# Altium integrated library WE_WR-TBL_Spring Clamp System_5.00 mm_rev15b.IntLib: 98 symbols
Pins are listed as number, name and electrical type; pins without a type are passive.

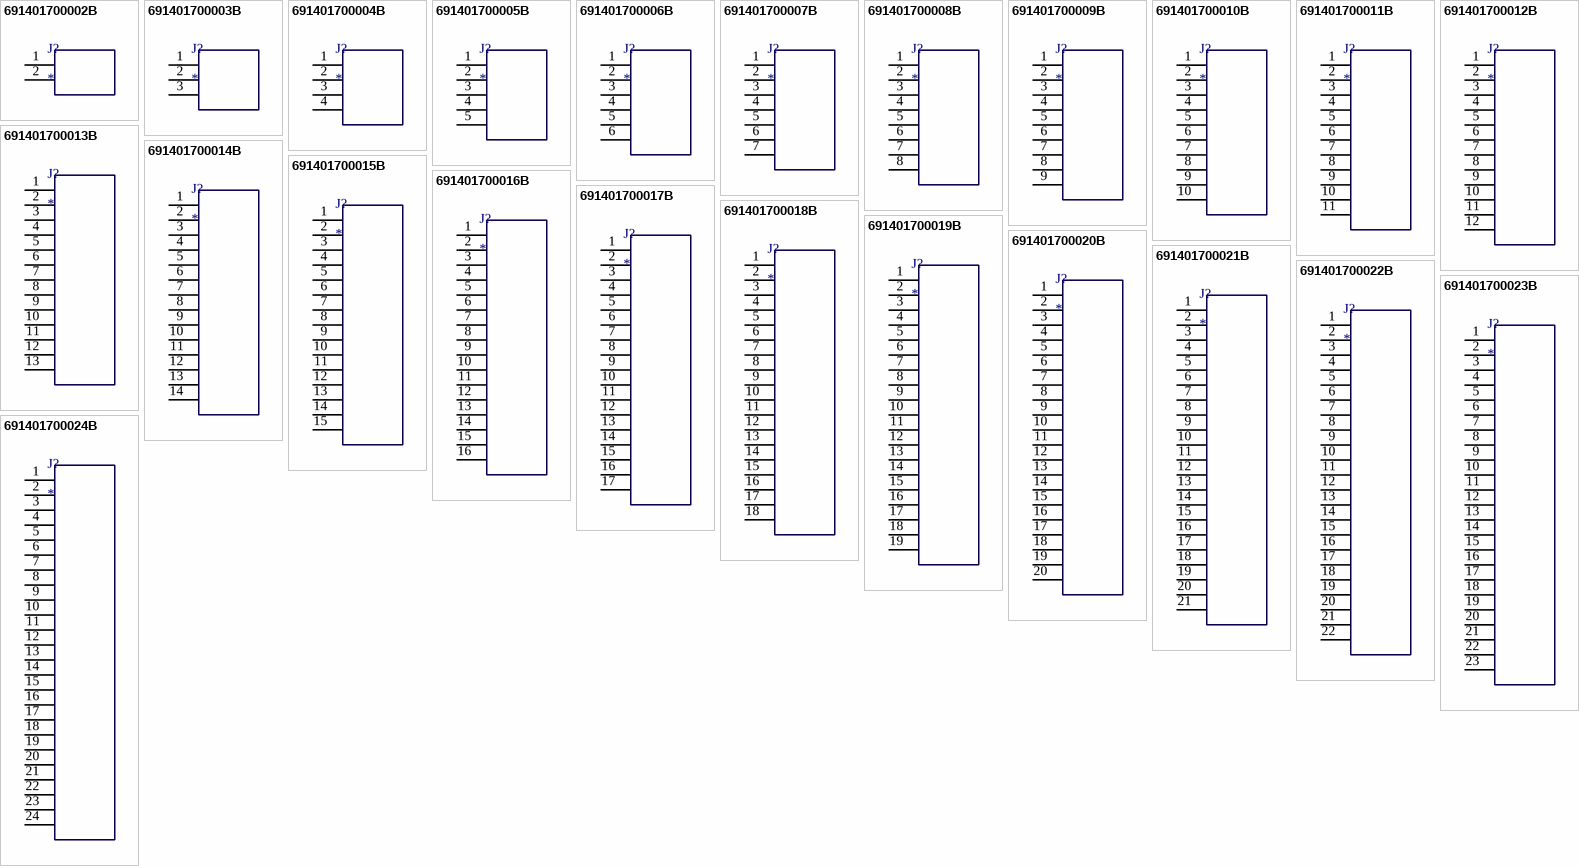
[diagram p0: symbols 691401700002B to 691401700024B]

## 691401700002B
designator J?
WR-TBL Screwless Entry Vertical,Serie 401 B - 5.00 mm; Manufacturer: Würth Elektronik eiSos GmbH; partNo: 691401700002B; ComponentLink1 Description: Manufacturer; ComponentLink2 Description: Datasheet; NoPins: 4; ComponentLink1URL: http://www.we-online.de; ComponentLink2URL: http://katalog.we-online.de/em/datasheet/6914017000xx.pdf; Created by: Karrer Zheng; Created Date: 10/10/2014
footprint 691401700002B
pins: 1  , 2  

## 691401700003B
designator J?
WR-TBL Screwless Entry Vertical,Serie 401 B - 5.00 mm; Manufacturer: Würth Elektronik eiSos GmbH; partNo: 691401700003B; ComponentLink1 Description: Manufacturer; ComponentLink2 Description: Datasheet; NoPins: 6; ComponentLink1URL: http://www.we-online.de; ComponentLink2URL: http://katalog.we-online.de/em/datasheet/6914017000xx.pdf; Created by: Karrer Zheng; Created Date: 10/10/2014
footprint 691401700003B
pins: 1  , 2  , 3  

## 691401700004B
designator J?
WR-TBL Screwless Entry Vertical,Serie 401 B - 5.00 mm; Manufacturer: Würth Elektronik eiSos GmbH; partNo: 691401700004B; ComponentLink1 Description: Manufacturer; ComponentLink2 Description: Datasheet; NoPins: 8; ComponentLink1URL: http://www.we-online.de; ComponentLink2URL: http://katalog.we-online.de/em/datasheet/6914017000xx.pdf; Created by: Karrer Zheng; Created Date: 10/10/2014
footprint 691401700004B
pins: 1  , 2  , 3  , 4  

## 691401700005B
designator J?
WR-TBL Screwless Entry Vertical,Serie 401 B - 5.00 mm; Manufacturer: Würth Elektronik eiSos GmbH; partNo: 691401700005B; ComponentLink1 Description: Manufacturer; ComponentLink2 Description: Datasheet; NoPins: 10; ComponentLink1URL: http://www.we-online.de; ComponentLink2URL: http://katalog.we-online.de/em/datasheet/6914017000xx.pdf; Created by: Karrer Zheng; Created Date: 10/10/2014
footprint 691401700005B
pins: 1  , 2  , 3  , 4  , 5  

## 691401700006B
designator J?
WR-TBL Screwless Entry Vertical,Serie 401 B - 5.00 mm; Manufacturer: Würth Elektronik eiSos GmbH; partNo: 691401700006B; ComponentLink1 Description: Manufacturer; ComponentLink2 Description: Datasheet; NoPins: 12; ComponentLink1URL: http://www.we-online.de; ComponentLink2URL: http://katalog.we-online.de/em/datasheet/6914017000xx.pdf; Created by: Karrer Zheng; Created Date: 10/10/2014
footprint 691401700006B
pins: 1  , 2  , 3  , 4  , 5  , 6  

## 691401700007B
designator J?
WR-TBL Screwless Entry Vertical,Serie 401 B - 5.00 mm; Manufacturer: Würth Elektronik eiSos GmbH; partNo: 691401700007B; ComponentLink1 Description: Manufacturer; ComponentLink2 Description: Datasheet; NoPins: 14; ComponentLink1URL: http://www.we-online.de; ComponentLink2URL: http://katalog.we-online.de/em/datasheet/6914017000xx.pdf; Created by: Karrer Zheng; Created Date: 10/10/2014
footprint 691401700007B
pins: 1  , 2  , 3  , 4  , 5  , 6  , 7  

## 691401700008B
designator J?
WR-TBL Screwless Entry Vertical,Serie 401 B - 5.00 mm; Manufacturer: Würth Elektronik eiSos GmbH; partNo: 691401700008B; ComponentLink1 Description: Manufacturer; ComponentLink2 Description: Datasheet; NoPins: 16; ComponentLink1URL: http://www.we-online.de; ComponentLink2URL: http://katalog.we-online.de/em/datasheet/6914017000xx.pdf; Created by: Karrer Zheng; Created Date: 10/10/2014
footprint 691401700008B
pins: 1  , 2  , 3  , 4  , 5  , 6  , 7  , 8  

## 691401700009B
designator J?
WR-TBL Screwless Entry Vertical,Serie 401 B - 5.00 mm; Manufacturer: Würth Elektronik eiSos GmbH; partNo: 691401700009B; ComponentLink1 Description: Manufacturer; ComponentLink2 Description: Datasheet; NoPins: 18; ComponentLink1URL: http://www.we-online.de; ComponentLink2URL: http://katalog.we-online.de/em/datasheet/6914017000xx.pdf; Created by: Karrer Zheng; Created Date: 10/10/2014
footprint 691401700009B
pins: 1  , 2  , 3  , 4  , 5  , 6  , 7  , 8  , 9  

## 691401700010B
designator J?
WR-TBL Screwless Entry Vertical,Serie 401 B - 5.00 mm; Manufacturer: Würth Elektronik eiSos GmbH; partNo: 691401700010B; ComponentLink1 Description: Manufacturer; ComponentLink2 Description: Datasheet; NoPins: 20; ComponentLink1URL: http://www.we-online.de; ComponentLink2URL: http://katalog.we-online.de/em/datasheet/6914017000xx.pdf; Created by: Karrer Zheng; Created Date: 10/10/2014
footprint 691401700010B
pins: 1  , 2  , 3  , 4  , 5  , 6  , 7  , 8  , 9  , 10  

## 691401700011B
designator J?
WR-TBL Screwless Entry Vertical,Serie 401 B - 5.00 mm; Manufacturer: Würth Elektronik eiSos GmbH; partNo: 691401700011B; ComponentLink1 Description: Manufacturer; ComponentLink2 Description: Datasheet; NoPins: 22; ComponentLink1URL: http://www.we-online.de; ComponentLink2URL: http://katalog.we-online.de/em/datasheet/6914017000xx.pdf; Created by: Karrer Zheng; Created Date: 10/10/2014
footprint 691401700011B
pins: 1  , 2  , 3  , 4  , 5  , 6  , 7  , 8  , 9  , 10  , 11  

## 691401700012B
designator J?
WR-TBL Screwless Entry Vertical,Serie 401 B - 5.00 mm; Manufacturer: Würth Elektronik eiSos GmbH; partNo: 691401700012B; ComponentLink1 Description: Manufacturer; ComponentLink2 Description: Datasheet; NoPins: 24; ComponentLink1URL: http://www.we-online.de; ComponentLink2URL: http://katalog.we-online.de/em/datasheet/6914017000xx.pdf; Created by: Karrer Zheng; Created Date: 10/10/2014
footprint 691401700012B
pins: 1  , 2  , 3  , 4  , 5  , 6  , 7  , 8  , 9  , 10  , 11  , 12  

## 691401700013B
designator J?
WR-TBL Screwless Entry Vertical,Serie 401 B - 5.00 mm; Manufacturer: Würth Elektronik eiSos GmbH; partNo: 691401700013B; ComponentLink1 Description: Manufacturer; ComponentLink2 Description: Datasheet; NoPins: 26; ComponentLink1URL: http://www.we-online.de; ComponentLink2URL: http://katalog.we-online.de/em/datasheet/6914017000xx.pdf; Created by: Karrer Zheng; Created Date: 10/10/2014
footprint 691401700013B
pins: 1  , 2  , 3  , 4  , 5  , 6  , 7  , 8  , 9  , 10  , 11  , 12  , 13  

## 691401700014B
designator J?
WR-TBL Screwless Entry Vertical,Serie 401 B - 5.00 mm; Manufacturer: Würth Elektronik eiSos GmbH; partNo: 691401700014B; ComponentLink1 Description: Manufacturer; ComponentLink2 Description: Datasheet; NoPins: 28; ComponentLink1URL: http://www.we-online.de; ComponentLink2URL: http://katalog.we-online.de/em/datasheet/6914017000xx.pdf; Created by: Karrer Zheng; Created Date: 10/10/2014
footprint 691401700014B
pins: 1  , 2  , 3  , 4  , 5  , 6  , 7  , 8  , 9  , 10  , 11  , 12  , 13  , 14  

## 691401700015B
designator J?
WR-TBL Screwless Entry Vertical,Serie 401 B - 5.00 mm; Manufacturer: Würth Elektronik eiSos GmbH; partNo: 691401700015B; ComponentLink1 Description: Manufacturer; ComponentLink2 Description: Datasheet; NoPins: 30; ComponentLink1URL: http://www.we-online.de; ComponentLink2URL: http://katalog.we-online.de/em/datasheet/6914017000xx.pdf; Created by: Karrer Zheng; Created Date: 10/10/2014
footprint 691401700015B
pins: 1  , 2  , 3  , 4  , 5  , 6  , 7  , 8  , 9  , 10  , 11  , 12  , 13  , 14  , 15  

## 691401700016B
designator J?
WR-TBL Screwless Entry Vertical,Serie 401 B - 5.00 mm; Manufacturer: Würth Elektronik eiSos GmbH; partNo: 691401700016B; ComponentLink1 Description: Manufacturer; ComponentLink2 Description: Datasheet; NoPins: 32; ComponentLink1URL: http://www.we-online.de; ComponentLink2URL: http://katalog.we-online.de/em/datasheet/6914017000xx.pdf; Created by: Karrer Zheng; Created Date: 10/10/2014
footprint 691401700016B
pins: 1  , 2  , 3  , 4  , 5  , 6  , 7  , 8  , 9  , 10  , 11  , 12  , 13  , 14  , 15  , 16  

## 691401700017B
designator J?
WR-TBL Screwless Entry Vertical,Serie 401 B - 5.00 mm; Manufacturer: Würth Elektronik eiSos GmbH; partNo: 691401700017B; ComponentLink1 Description: Manufacturer; ComponentLink2 Description: Datasheet; NoPins: 34; ComponentLink1URL: http://www.we-online.de; ComponentLink2URL: http://katalog.we-online.de/em/datasheet/6914017000xx.pdf; Created by: Karrer Zheng; Created Date: 10/10/2014
footprint 691401700017B
pins: 1  , 2  , 3  , 4  , 5  , 6  , 7  , 8  , 9  , 10  , 11  , 12  , 13  , 14  , 15  , 16  , 17  

## 691401700018B
designator J?
WR-TBL Screwless Entry Vertical,Serie 401 B - 5.00 mm; Manufacturer: Würth Elektronik eiSos GmbH; partNo: 691401700018B; ComponentLink1 Description: Manufacturer; ComponentLink2 Description: Datasheet; NoPins: 36; ComponentLink1URL: http://www.we-online.de; ComponentLink2URL: http://katalog.we-online.de/em/datasheet/6914017000xx.pdf; Created by: Karrer Zheng; Created Date: 10/10/2014
footprint 691401700018B
pins: 1  , 2  , 3  , 4  , 5  , 6  , 7  , 8  , 9  , 10  , 11  , 12  , 13  , 14  , 15  , 16  , 17  , 18  

## 691401700019B
designator J?
WR-TBL Screwless Entry Vertical,Serie 401 B - 5.00 mm; Manufacturer: Würth Elektronik eiSos GmbH; partNo: 691401700019B; ComponentLink1 Description: Manufacturer; ComponentLink2 Description: Datasheet; NoPins: 38; ComponentLink1URL: http://www.we-online.de; ComponentLink2URL: http://katalog.we-online.de/em/datasheet/6914017000xx.pdf; Created by: Karrer Zheng; Created Date: 10/10/2014
footprint 691401700019B
pins: 1  , 2  , 3  , 4  , 5  , 6  , 7  , 8  , 9  , 10  , 11  , 12  , 13  , 14  , 15  , 16  , 17  , 18  , 19  

## 691401700020B
designator J?
WR-TBL Screwless Entry Vertical,Serie 401 B - 5.00 mm; Manufacturer: Würth Elektronik eiSos GmbH; partNo: 691401700020B; ComponentLink1 Description: Manufacturer; ComponentLink2 Description: Datasheet; NoPins: 40; ComponentLink1URL: http://www.we-online.de; ComponentLink2URL: http://katalog.we-online.de/em/datasheet/6914017000xx.pdf; Created by: Karrer Zheng; Created Date: 10/10/2014
footprint 691401700020B
pins: 1  , 2  , 3  , 4  , 5  , 6  , 7  , 8  , 9  , 10  , 11  , 12  , 13  , 14  , 15  , 16  , 17  , 18  , 19  , 20  

## 691401700021B
designator J?
WR-TBL Screwless Entry Vertical,Serie 401 B - 5.00 mm; Manufacturer: Würth Elektronik eiSos GmbH; partNo: 691401700021B; ComponentLink1 Description: Manufacturer; ComponentLink2 Description: Datasheet; NoPins: 42; ComponentLink1URL: http://www.we-online.de; ComponentLink2URL: http://katalog.we-online.de/em/datasheet/6914017000xx.pdf; Created by: Karrer Zheng; Created Date: 10/10/2014
footprint 691401700021B
pins: 1  , 2  , 3  , 4  , 5  , 6  , 7  , 8  , 9  , 10  , 11  , 12  , 13  , 14  , 15  , 16  , 17  , 18  , 19  , 20  , 21  

## 691401700022B
designator J?
WR-TBL Screwless Entry Vertical,Serie 401 B - 5.00 mm; Manufacturer: Würth Elektronik eiSos GmbH; partNo: 691401700022B; ComponentLink1 Description: Manufacturer; ComponentLink2 Description: Datasheet; NoPins: 44; ComponentLink1URL: http://www.we-online.de; ComponentLink2URL: http://katalog.we-online.de/em/datasheet/6914017000xx.pdf; Created by: Karrer Zheng; Created Date: 10/10/2014
footprint 691401700022B
pins: 1  , 2  , 3  , 4  , 5  , 6  , 7  , 8  , 9  , 10  , 11  , 12  , 13  , 14  , 15  , 16  , 17  , 18  , 19  , 20  , 21  , 22  

## 691401700023B
designator J?
WR-TBL Screwless Entry Vertical,Serie 401 B - 5.00 mm; Manufacturer: Würth Elektronik eiSos GmbH; partNo: 691401700023B; ComponentLink1 Description: Manufacturer; ComponentLink2 Description: Datasheet; NoPins: 46; ComponentLink1URL: http://www.we-online.de; ComponentLink2URL: http://katalog.we-online.de/em/datasheet/6914017000xx.pdf; Created by: Karrer Zheng; Created Date: 10/10/2014
footprint 691401700023B
pins: 1  , 2  , 3  , 4  , 5  , 6  , 7  , 8  , 9  , 10  , 11  , 12  , 13  , 14  , 15  , 16  , 17  , 18  , 19  , 20  , 21  , 22  , 23  

## 691401700024B
designator J?
WR-TBL Screwless Entry Vertical,Serie 401 B - 5.00 mm; Manufacturer: Würth Elektronik eiSos GmbH; partNo: 691401700024B; ComponentLink1 Description: Manufacturer; ComponentLink2 Description: Datasheet; NoPins: 48; ComponentLink1URL: http://www.we-online.de; ComponentLink2URL: http://katalog.we-online.de/em/datasheet/6914017000xx.pdf; Created by: Karrer Zheng; Created Date: 10/10/2014
footprint 691401700024B
pins: 1  , 2  , 3  , 4  , 5  , 6  , 7  , 8  , 9  , 10  , 11  , 12  , 13  , 14  , 15  , 16  , 17  , 18  , 19  , 20  , 21  , 22  , 23  , 24  


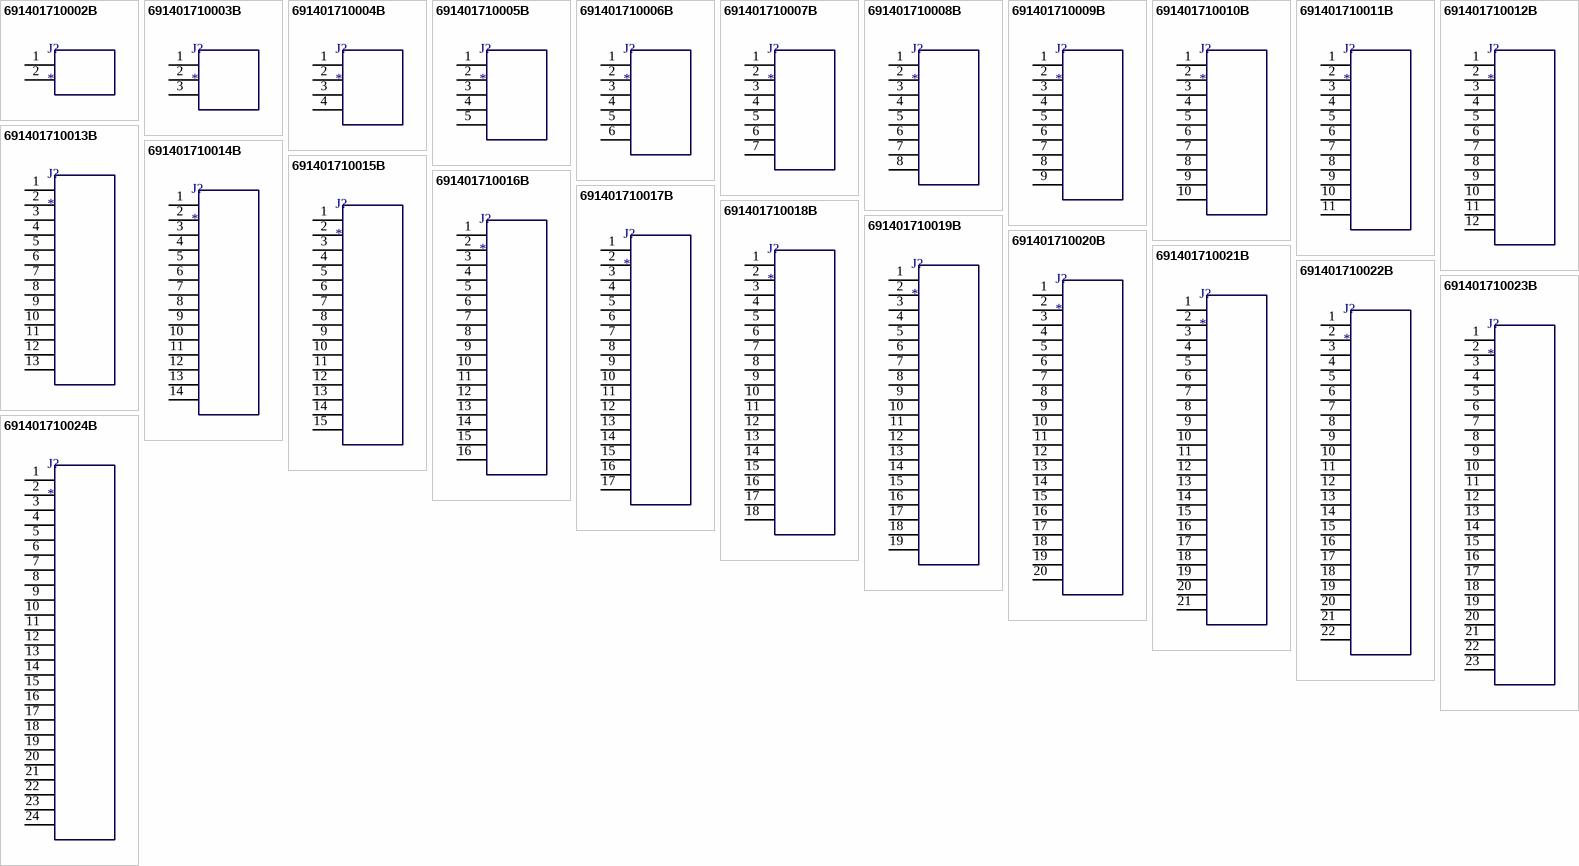
[diagram p1: symbols 691401710002B to 691401710024B]

## 691401710002B
designator J?
WR-TBL Screwless Entry Horizontal,Serie 401 B - 5.00 mm; Manufacturer: Würth Elektronik eiSos GmbH; partNo: 691401710002B; ComponentLink1 Description: Manufacturer; ComponentLink2 Description: Datasheet; NoPins: 4; ComponentLink1URL: http://www.we-online.de; ComponentLink2URL: http://katalog.we-online.de/em/datasheet/6914017100xx.pdf; Created by: Karrer Zheng; Created Date: 10/10/2014
footprint 691401710002B
pins: 1  , 2  

## 691401710003B
designator J?
WR-TBL Screwless Entry Horizontal,Serie 401 B - 5.00 mm; Manufacturer: Würth Elektronik eiSos GmbH; partNo: 691401710003B; ComponentLink1 Description: Manufacturer; ComponentLink2 Description: Datasheet; NoPins: 6; ComponentLink1URL: http://www.we-online.de; ComponentLink2URL: http://katalog.we-online.de/em/datasheet/6914017100xx.pdf; Created by: Karrer Zheng; Created Date: 10/10/2014
footprint 691401710003B
pins: 1  , 2  , 3  

## 691401710004B
designator J?
WR-TBL Screwless Entry Horizontal,Serie 401 B - 5.00 mm; Manufacturer: Würth Elektronik eiSos GmbH; partNo: 691401710004B; ComponentLink1 Description: Manufacturer; ComponentLink2 Description: Datasheet; NoPins: 8; ComponentLink1URL: http://www.we-online.de; ComponentLink2URL: http://katalog.we-online.de/em/datasheet/6914017100xx.pdf; Created by: Karrer Zheng; Created Date: 10/10/2014
footprint 691401710004B
pins: 1  , 2  , 3  , 4  

## 691401710005B
designator J?
WR-TBL Screwless Entry Horizontal,Serie 401 B - 5.00 mm; Manufacturer: Würth Elektronik eiSos GmbH; partNo: 691401710005B; ComponentLink1 Description: Manufacturer; ComponentLink2 Description: Datasheet; NoPins: 10; ComponentLink1URL: http://www.we-online.de; ComponentLink2URL: http://katalog.we-online.de/em/datasheet/6914017100xx.pdf; Created by: Karrer Zheng; Created Date: 10/10/2014
footprint 691401710005B
pins: 1  , 2  , 3  , 4  , 5  

## 691401710006B
designator J?
WR-TBL Screwless Entry Horizontal,Serie 401 B - 5.00 mm; Manufacturer: Würth Elektronik eiSos GmbH; partNo: 691401710006B; ComponentLink1 Description: Manufacturer; ComponentLink2 Description: Datasheet; NoPins: 12; ComponentLink1URL: http://www.we-online.de; ComponentLink2URL: http://katalog.we-online.de/em/datasheet/6914017100xx.pdf; Created by: Karrer Zheng; Created Date: 10/10/2014
footprint 691401710006B
pins: 1  , 2  , 3  , 4  , 5  , 6  

## 691401710007B
designator J?
WR-TBL Screwless Entry Horizontal,Serie 401 B - 5.00 mm; Manufacturer: Würth Elektronik eiSos GmbH; partNo: 691401710007B; ComponentLink1 Description: Manufacturer; ComponentLink2 Description: Datasheet; NoPins: 14; ComponentLink1URL: http://www.we-online.de; ComponentLink2URL: http://katalog.we-online.de/em/datasheet/6914017100xx.pdf; Created by: Karrer Zheng; Created Date: 10/10/2014
footprint 691401710007B
pins: 1  , 2  , 3  , 4  , 5  , 6  , 7  

## 691401710008B
designator J?
WR-TBL Screwless Entry Horizontal,Serie 401 B - 5.00 mm; Manufacturer: Würth Elektronik eiSos GmbH; partNo: 691401710008B; ComponentLink1 Description: Manufacturer; ComponentLink2 Description: Datasheet; NoPins: 16; ComponentLink1URL: http://www.we-online.de; ComponentLink2URL: http://katalog.we-online.de/em/datasheet/6914017100xx.pdf; Created by: Karrer Zheng; Created Date: 10/10/2014
footprint 691401710008B
pins: 1  , 2  , 3  , 4  , 5  , 6  , 7  , 8  

## 691401710009B
designator J?
WR-TBL Screwless Entry Horizontal,Serie 401 B - 5.00 mm; Manufacturer: Würth Elektronik eiSos GmbH; partNo: 691401710009B; ComponentLink1 Description: Manufacturer; ComponentLink2 Description: Datasheet; NoPins: 18; ComponentLink1URL: http://www.we-online.de; ComponentLink2URL: http://katalog.we-online.de/em/datasheet/6914017100xx.pdf; Created by: Karrer Zheng; Created Date: 10/10/2014
footprint 691401710009B
pins: 1  , 2  , 3  , 4  , 5  , 6  , 7  , 8  , 9  

## 691401710010B
designator J?
WR-TBL Screwless Entry Horizontal,Serie 401 B - 5.00 mm; Manufacturer: Würth Elektronik eiSos GmbH; partNo: 691401710010B; ComponentLink1 Description: Manufacturer; ComponentLink2 Description: Datasheet; NoPins: 20; ComponentLink1URL: http://www.we-online.de; ComponentLink2URL: http://katalog.we-online.de/em/datasheet/6914017100xx.pdf; Created by: Karrer Zheng; Created Date: 10/10/2014
footprint 691401710010B
pins: 1  , 2  , 3  , 4  , 5  , 6  , 7  , 8  , 9  , 10  

## 691401710011B
designator J?
WR-TBL Screwless Entry Horizontal,Serie 401 B - 5.00 mm; Manufacturer: Würth Elektronik eiSos GmbH; partNo: 691401710011B; ComponentLink1 Description: Manufacturer; ComponentLink2 Description: Datasheet; NoPins: 22; ComponentLink1URL: http://www.we-online.de; ComponentLink2URL: http://katalog.we-online.de/em/datasheet/6914017100xx.pdf; Created by: Karrer Zheng; Created Date: 10/10/2014
footprint 691401710011B
pins: 1  , 2  , 3  , 4  , 5  , 6  , 7  , 8  , 9  , 10  , 11  

## 691401710012B
designator J?
WR-TBL Screwless Entry Horizontal,Serie 401 B - 5.00 mm; Manufacturer: Würth Elektronik eiSos GmbH; partNo: 691401710012B; ComponentLink1 Description: Manufacturer; ComponentLink2 Description: Datasheet; NoPins: 24; ComponentLink1URL: http://www.we-online.de; ComponentLink2URL: http://katalog.we-online.de/em/datasheet/6914017100xx.pdf; Created by: Karrer Zheng; Created Date: 10/10/2014
footprint 691401710012B
pins: 1  , 2  , 3  , 4  , 5  , 6  , 7  , 8  , 9  , 10  , 11  , 12  

## 691401710013B
designator J?
WR-TBL Screwless Entry Horizontal,Serie 401 B - 5.00 mm; Manufacturer: Würth Elektronik eiSos GmbH; partNo: 691401710013B; ComponentLink1 Description: Manufacturer; ComponentLink2 Description: Datasheet; NoPins: 26; ComponentLink1URL: http://www.we-online.de; ComponentLink2URL: http://katalog.we-online.de/em/datasheet/6914017100xx.pdf; Created by: Karrer Zheng; Created Date: 10/10/2014
footprint 691401710013B
pins: 1  , 2  , 3  , 4  , 5  , 6  , 7  , 8  , 9  , 10  , 11  , 12  , 13  

## 691401710014B
designator J?
WR-TBL Screwless Entry Horizontal,Serie 401 B - 5.00 mm; Manufacturer: Würth Elektronik eiSos GmbH; partNo: 691401710014B; ComponentLink1 Description: Manufacturer; ComponentLink2 Description: Datasheet; NoPins: 28; ComponentLink1URL: http://www.we-online.de; ComponentLink2URL: http://katalog.we-online.de/em/datasheet/6914017100xx.pdf; Created by: Karrer Zheng; Created Date: 10/10/2014
footprint 691401710014B
pins: 1  , 2  , 3  , 4  , 5  , 6  , 7  , 8  , 9  , 10  , 11  , 12  , 13  , 14  

## 691401710015B
designator J?
WR-TBL Screwless Entry Horizontal,Serie 401 B - 5.00 mm; Manufacturer: Würth Elektronik eiSos GmbH; partNo: 691401710015B; ComponentLink1 Description: Manufacturer; ComponentLink2 Description: Datasheet; NoPins: 30; ComponentLink1URL: http://www.we-online.de; ComponentLink2URL: http://katalog.we-online.de/em/datasheet/6914017100xx.pdf; Created by: Karrer Zheng; Created Date: 10/10/2014
footprint 691401710015B
pins: 1  , 2  , 3  , 4  , 5  , 6  , 7  , 8  , 9  , 10  , 11  , 12  , 13  , 14  , 15  

## 691401710016B
designator J?
WR-TBL Screwless Entry Horizontal,Serie 401 B - 5.00 mm; Manufacturer: Würth Elektronik eiSos GmbH; partNo: 691401710016B; ComponentLink1 Description: Manufacturer; ComponentLink2 Description: Datasheet; NoPins: 32; ComponentLink1URL: http://www.we-online.de; ComponentLink2URL: http://katalog.we-online.de/em/datasheet/6914017100xx.pdf; Created by: Karrer Zheng; Created Date: 10/10/2014
footprint 691401710016B
pins: 1  , 2  , 3  , 4  , 5  , 6  , 7  , 8  , 9  , 10  , 11  , 12  , 13  , 14  , 15  , 16  

## 691401710017B
designator J?
WR-TBL Screwless Entry Horizontal,Serie 401 B - 5.00 mm; Manufacturer: Würth Elektronik eiSos GmbH; partNo: 691401710017B; ComponentLink1 Description: Manufacturer; ComponentLink2 Description: Datasheet; NoPins: 34; ComponentLink1URL: http://www.we-online.de; ComponentLink2URL: http://katalog.we-online.de/em/datasheet/6914017100xx.pdf; Created by: Karrer Zheng; Created Date: 10/10/2014
footprint 691401710017B
pins: 1  , 2  , 3  , 4  , 5  , 6  , 7  , 8  , 9  , 10  , 11  , 12  , 13  , 14  , 15  , 16  , 17  

## 691401710018B
designator J?
WR-TBL Screwless Entry Horizontal,Serie 401 B - 5.00 mm; Manufacturer: Würth Elektronik eiSos GmbH; partNo: 691401710018B; ComponentLink1 Description: Manufacturer; ComponentLink2 Description: Datasheet; NoPins: 36; ComponentLink1URL: http://www.we-online.de; ComponentLink2URL: http://katalog.we-online.de/em/datasheet/6914017100xx.pdf; Created by: Karrer Zheng; Created Date: 10/10/2014
footprint 691401710018B
pins: 1  , 2  , 3  , 4  , 5  , 6  , 7  , 8  , 9  , 10  , 11  , 12  , 13  , 14  , 15  , 16  , 17  , 18  

## 691401710019B
designator J?
WR-TBL Screwless Entry Horizontal,Serie 401 B - 5.00 mm; Manufacturer: Würth Elektronik eiSos GmbH; partNo: 691401710019B; ComponentLink1 Description: Manufacturer; ComponentLink2 Description: Datasheet; NoPins: 38; ComponentLink1URL: http://www.we-online.de; ComponentLink2URL: http://katalog.we-online.de/em/datasheet/6914017100xx.pdf; Created by: Karrer Zheng; Created Date: 10/10/2014
footprint 691401710019B
pins: 1  , 2  , 3  , 4  , 5  , 6  , 7  , 8  , 9  , 10  , 11  , 12  , 13  , 14  , 15  , 16  , 17  , 18  , 19  

## 691401710020B
designator J?
WR-TBL Screwless Entry Horizontal,Serie 401 B - 5.00 mm; Manufacturer: Würth Elektronik eiSos GmbH; partNo: 691401710020B; ComponentLink1 Description: Manufacturer; ComponentLink2 Description: Datasheet; NoPins: 40; ComponentLink1URL: http://www.we-online.de; ComponentLink2URL: http://katalog.we-online.de/em/datasheet/6914017100xx.pdf; Created by: Karrer Zheng; Created Date: 10/10/2014
footprint 691401710020B
pins: 1  , 2  , 3  , 4  , 5  , 6  , 7  , 8  , 9  , 10  , 11  , 12  , 13  , 14  , 15  , 16  , 17  , 18  , 19  , 20  

## 691401710021B
designator J?
WR-TBL Screwless Entry Horizontal,Serie 401 B - 5.00 mm; Manufacturer: Würth Elektronik eiSos GmbH; partNo: 691401710021B; ComponentLink1 Description: Manufacturer; ComponentLink2 Description: Datasheet; NoPins: 42; ComponentLink1URL: http://www.we-online.de; ComponentLink2URL: http://katalog.we-online.de/em/datasheet/6914017100xx.pdf; Created by: Karrer Zheng; Created Date: 10/10/2014
footprint 691401710021B
pins: 1  , 2  , 3  , 4  , 5  , 6  , 7  , 8  , 9  , 10  , 11  , 12  , 13  , 14  , 15  , 16  , 17  , 18  , 19  , 20  , 21  

## 691401710022B
designator J?
WR-TBL Screwless Entry Horizontal,Serie 401 B - 5.00 mm; Manufacturer: Würth Elektronik eiSos GmbH; partNo: 691401710022B; ComponentLink1 Description: Manufacturer; ComponentLink2 Description: Datasheet; NoPins: 44; ComponentLink1URL: http://www.we-online.de; ComponentLink2URL: http://katalog.we-online.de/em/datasheet/6914017100xx.pdf; Created by: Karrer Zheng; Created Date: 10/10/2014
footprint 691401710022B
pins: 1  , 2  , 3  , 4  , 5  , 6  , 7  , 8  , 9  , 10  , 11  , 12  , 13  , 14  , 15  , 16  , 17  , 18  , 19  , 20  , 21  , 22  

## 691401710023B
designator J?
WR-TBL Screwless Entry Horizontal,Serie 401 B - 5.00 mm; Manufacturer: Würth Elektronik eiSos GmbH; partNo: 691401710023B; ComponentLink1 Description: Manufacturer; ComponentLink2 Description: Datasheet; NoPins: 46; ComponentLink1URL: http://www.we-online.de; ComponentLink2URL: http://katalog.we-online.de/em/datasheet/6914017100xx.pdf; Created by: Karrer Zheng; Created Date: 10/10/2014
footprint 691401710023B
pins: 1  , 2  , 3  , 4  , 5  , 6  , 7  , 8  , 9  , 10  , 11  , 12  , 13  , 14  , 15  , 16  , 17  , 18  , 19  , 20  , 21  , 22  , 23  

## 691401710024B
designator J?
WR-TBL Screwless Entry Horizontal,Serie 401 B - 5.00 mm; Manufacturer: Würth Elektronik eiSos GmbH; partNo: 691401710024B; ComponentLink1 Description: Manufacturer; ComponentLink2 Description: Datasheet; NoPins: 48; ComponentLink1URL: http://www.we-online.de; ComponentLink2URL: http://katalog.we-online.de/em/datasheet/6914017100xx.pdf; Created by: Karrer Zheng; Created Date: 10/10/2014
footprint 691401710024B
pins: 1  , 2  , 3  , 4  , 5  , 6  , 7  , 8  , 9  , 10  , 11  , 12  , 13  , 14  , 15  , 16  , 17  , 18  , 19  , 20  , 21  , 22  , 23  , 24  

